# Altium footprint library _components.PcbLib: 53 footprints (part 2 of 4)
Each footprint in its own frame and in the unit in brackets; x right, y up, seen from the top. Pads: shape width x height; smd on the part's side, far side on the other; paste and mask are expansions set on the pad; w line width, h text height; cw(c..) or ccw(c..) is an arc to the next point about the centre after c.
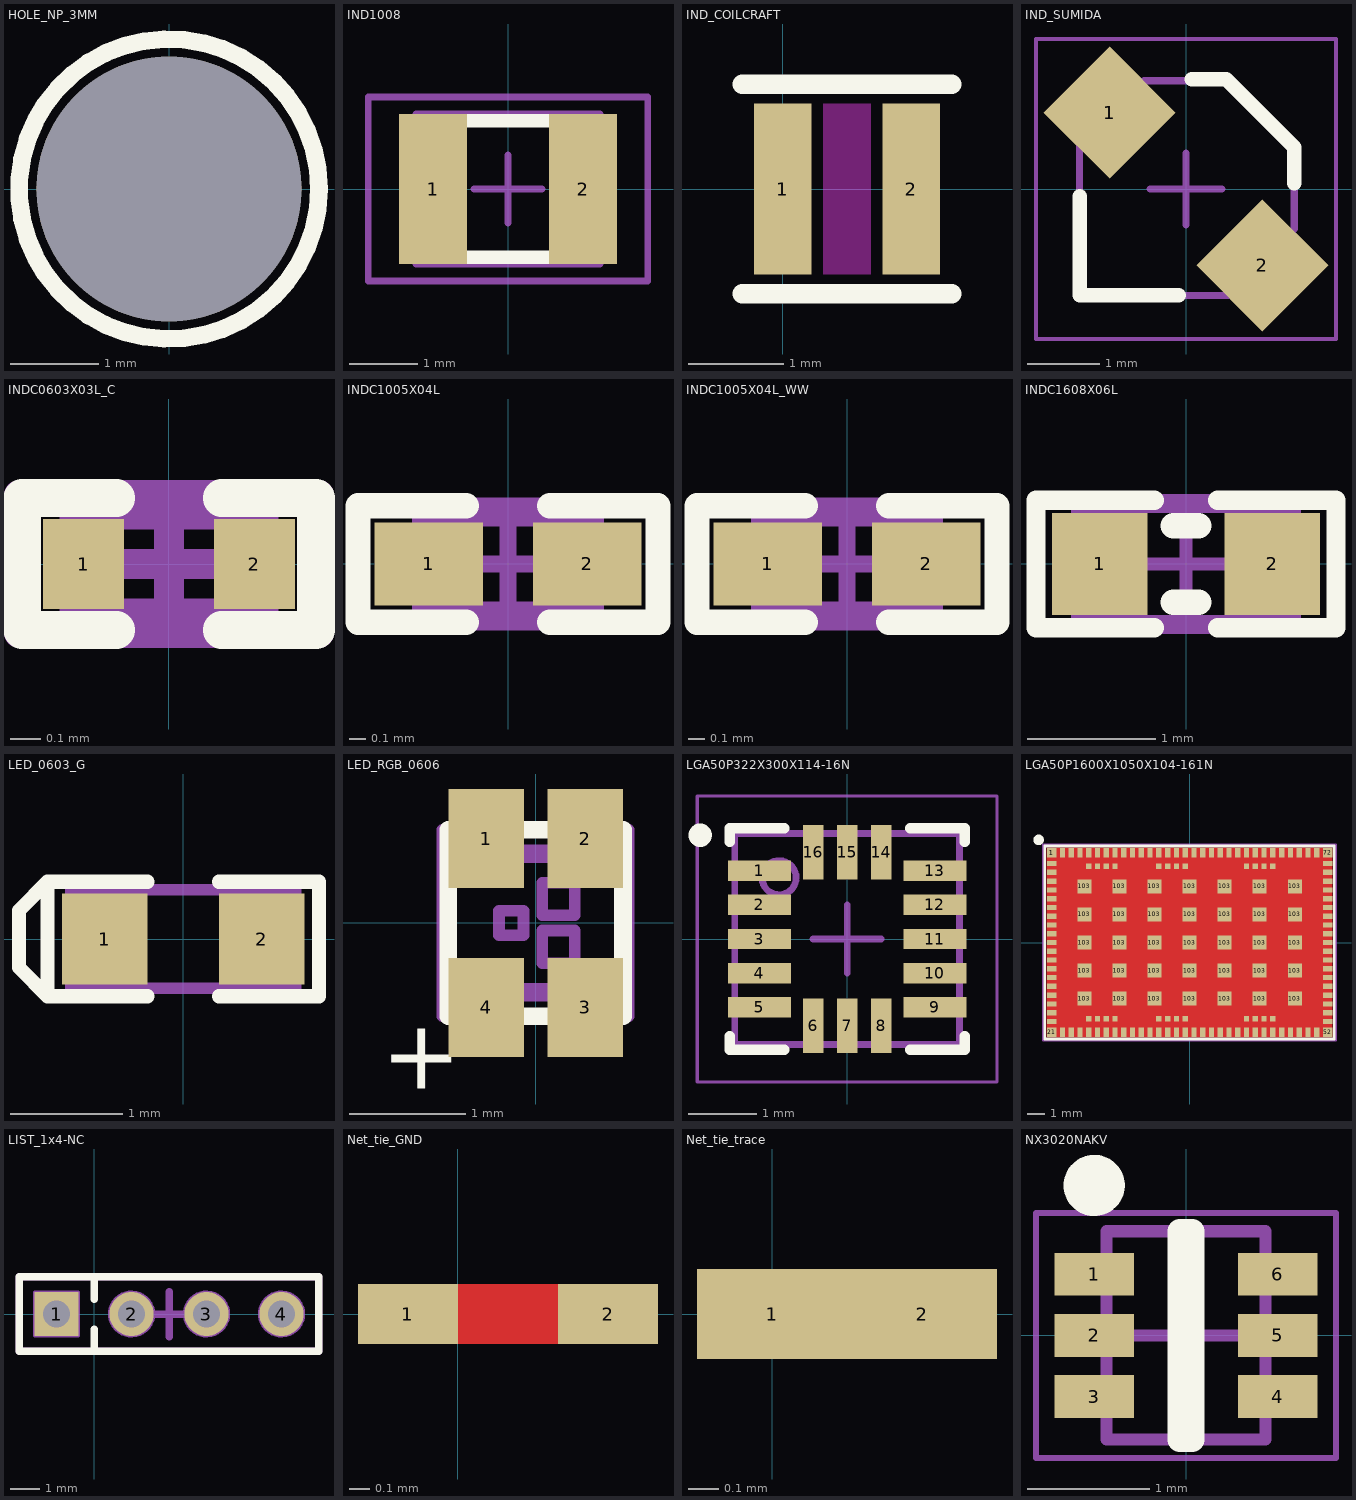
[diagram p1: the footprints below, top view; thin cyan lines are the x and y axes]

## HOLE_NP_3MM [mm] "Regular 3mm non-plated hole"
pads (1):
  round 3 hole 3 unplated paste+0 mask+0: ""(0,0)
Top Overlay:
  circle w0.2: c0,0 r1.7

## IND1008 [mm] "Chip Inductor, 2-Leads, Body 2.5x2.0x1.1 mm"
height 1.1
pads (2):
  rect 1x2.2 smd: 1(-1.1,0) 2(1.1,0)
Top Overlay:
  lines w0.2: -1.2,-1 1.2,-1 ; -1.2,1 1.2,1
Top Assembly Info:
  lines w0.1: -1.35,-1.1 -1.35,1.1 1.35,1.1 1.35,-1.1 -1.35,-1.1
  text ".Designator" at -0.4,-0.15 h0.38
Top Placement:
  lines w0.1: -0.5,0 0.5,0 ; 0,-0.5 0,0.5 ; -2.05,-1.35 -2.05,1.35 2.05,1.35 2.05,-1.35 -2.05,-1.35
3D body "74479787147.stp": height 0.89, standoff -0.01, extent -1.25,-1 1.25,1

## IND_COILCRAFT [mm]
pads (2):
  rect 0.6x1.8 smd: 1(0,0) 2(1.35,0)
Top Layer keep-out:
  rectangle: 0.425,-0.9 0.925,0.9
Top Overlay:
  lines w0.2: -0.425,-1.1 1.775,-1.1 ; -0.425,1.1 1.775,1.1

## IND_SUMIDA [mm]
height 1.3
pads (2):
  rect 1.3x1.3 smd rot 45: 1(-1.061,1.061) 2(1.061,-1.061)
Top Overlay:
  lines w0.2: -1.476,-0.1 -1.476,-1.476 -0.1,-1.476 ; 0.08,1.524 0.556,1.524 1.5,0.58 1.5,0.08
Top Assembly Info:
  lines w0.1: -1.476,0.58 -1.476,-1.476 0.58,-1.476 1.5,-0.556 1.5,0.58 0.58,1.5 -0.58,1.5 -1.476,0.604
  text ".Designator" at -0.275,-0.15 h0.3
Top Placement:
  lines w0.05: -2.08,-2.08 2.08,-2.08 2.08,2.08 -2.08,2.08 -2.08,-2.08
  lines w0.1: -0.5,0 0.5,0 ; 0,-0.5 0,0.5
3D body: height 0.9, standoff 0, extent 0.68,-1.482 1.475,-0.687
3D body: height 0.9, standoff 0, extent -1.476,0.699 -0.681,1.494
3D body: height 1.2, standoff 0, extent -1.389,-1.397 1.4,1.397
3D body: height 0.8, standoff 0, extent -1.476,-1.476 1.5,1.5

## INDC0603X03L_C [mm]
pads (2):
  rect 0.27x0.3 smd: 1(-0.285,0) 2(0.285,0)
Top Overlay:
  lines w0.125: -0.175,-0.22 -0.49,-0.22 -0.49,0.22 -0.175,0.22 ; 0.175,-0.22 0.49,-0.22 0.49,0.22 0.175,0.22
Top Assembly Info:
  lines w0.1: -0.315,-0.165 0.315,-0.165 0.315,0.165 -0.315,0.165 -0.315,-0.165
  text ".Designator" at -0.306,0.268 h0.3
Top Placement:
  lines w0.1: -0.165,0 0.165,0 ; 0,-0.165 0,0.165 ; -0.5,-0.23 0.5,-0.23 0.5,0.23 -0.5,0.23 -0.5,-0.23
3D body "User Library-smt_inductor-0201.step": height 0.26, standoff -0.01, extent -0.31,-0.16 0.31,0.16

## INDC1005X04L [mm] "0402 (imperial)"
pads (2):
  rect 0.65x0.5 smd: 1(-0.475,0) 2(0.475,0)
Top Overlay:
  lines w0.152: -0.25,-0.35 -0.9,-0.35 -0.9,0.35 -0.25,0.35 ; 0.25,-0.35 0.9,-0.35 0.9,0.35 0.25,0.35
Top Assembly Info:
  lines w0.1: -0.525,-0.275 -0.525,0.275 0.525,0.275 0.525,-0.275 -0.525,-0.275
  text ".Designator" at -0.432,-0.152 h0.3
Top Placement:
  lines w0.1: -0.275,0 0.275,0 ; 0,-0.275 0,0.275 ; -0.9,-0.35 -0.9,0.35 0.9,0.35 0.9,-0.35 -0.9,-0.35
3D body "User Library-Chip Inductor 0402.step": height 0.5, standoff 0, extent -0.5,-0.3 0.5,0.3

## INDC1005X04L_WW [mm]
pads (2):
  rect 0.65x0.5 smd: 1(-0.475,0) 2(0.475,0)
Top Overlay:
  lines w0.152: -0.25,-0.35 -0.9,-0.35 -0.9,0.35 -0.25,0.35 ; 0.25,-0.35 0.9,-0.35 0.9,0.35 0.25,0.35
Top Assembly Info:
  lines w0.1: -0.525,-0.275 0.525,-0.275 0.525,0.275 -0.525,0.275 -0.525,-0.275
  text ".Designator" at -0.432,-0.152 h0.3
Top Placement:
  lines w0.1: -0.275,0 0.275,0 ; 0,-0.275 0,0.275 ; -0.9,-0.35 0.9,-0.35 0.9,0.35 -0.9,0.35 -0.9,-0.35
3D body "User Library-INDC1005X50-MURATA_LQW15A.STEP": height 0.51, standoff 0, extent -0.5,-0.3 0.5,0.3

## INDC1608X06L [mm]
pads (2):
  rect 0.75x0.8 smd: 1(-0.675,0) 2(0.675,0)
Top Overlay:
  lines w0.152: -0.25,-0.5 -1.175,-0.5 -1.175,0.5 -0.25,0.5 ; 0.25,-0.5 1.175,-0.5 1.175,0.5 0.25,0.5
  lines w0.2: -0.1,-0.3 0.1,-0.3 ; -0.1,0.3 0.1,0.3
Top Assembly Info:
  lines w0.1: -0.85,-0.45 -0.85,0.45 0.85,0.45 0.85,-0.45 -0.85,-0.45
  text ".Designator" at -0.7,-0.2 h0.38
Top Placement:
  lines w0.1: -0.45,0 0.45,0 ; 0,-0.45 0,0.45 ; -1.175,-0.5 1.175,-0.5 1.175,0.5 -1.175,0.5 -1.175,-0.5
3D body "User Library-Chip Inductor.step": height 0.8, standoff 0, extent -0.8,-0.475 0.8,0.475

## LED_0603_G [mil]
pads (2):
  rect 30x32 smd: 1(-27.5,0) 2(27.5,0)
Top Overlay:
  lines w5: -12.5,-20 -47.5,-20 ; -12.5,20 -47.5,20 ; 12.5,-20 47.5,-20 47.5,20 12.5,20 ; -47.5,-20 -47.5,20 ; -47.5,-20 -57.5,-10 -57.5,10 -47.5,20
Top Assembly Info:
  lines w3.94: -27.56,-17.26 -27.56,17.26 ; -23.62,-17.26 -23.62,17.26 ; 23.62,-17.26 23.62,17.26 ; 27.56,-17.26 27.56,17.26 ; -39.37,-17.26 39.37,-17.26 39.37,17.26 -39.37,17.26 -39.37,-17.26
  text ".Designator" at -19.68,-4.92 h12
3D body "User Library-led_0603_green.step": height 23.62, standoff 0, extent -31.63,-15.75 32.15,15.75

## LED_RGB_0606 [mm]
pads (4):
  rect 0.65x0.85 smd paste+0: 1(-0.425,0.725) 2(0.425,0.725) 3(0.425,-0.725) 4(-0.425,-0.725)
Top Overlay:
  lines w0.15: -0.75,-0.8 0.75,-0.8 ; -0.75,0.8 0.75,0.8
  lines w0.152: -0.75,-0.8 -0.75,0.8 ; 0.75,-0.8 0.75,0.8
  text "+" at -1.325,-1.425 h0.6
Top Assembly Info:
  lines w0.1: -0.8,-0.625 -0.537,-0.625 ; -0.8,-0.565 0.8,-0.565 ; -0.8,0.565 0.8,0.565 ; -0.8,0.625 -0.537,0.625 ; -0.668,-0.8 cw(c-0.423,-0.851) -0.178,-0.8 ; -0.668,0.8 ccw(c-0.423,0.85) -0.178,0.8 ; -0.309,-0.625 0.309,-0.625 ; -0.309,0.625 0.309,0.625 ; 0.178,-0.8 cw(c0.423,-0.85) 0.668,-0.8 ; 0.178,0.8 ccw(c0.423,0.851) 0.668,0.8 ; 0.537,-0.625 0.8,-0.625 ; 0.537,0.625 0.8,0.625 ; -0.8,-0.8 -0.537,-0.8 cw(c-0.423,-0.851) -0.309,-0.8 0.309,-0.8 cw(c0.423,-0.85) 0.537,-0.8 0.8,-0.8 0.8,0.8 0.537,0.8 cw(c0.423,0.851) 0.309,0.8 -0.309,0.8 cw(c-0.423,0.85) -0.537,0.8 -0.8,0.8 -0.8,-0.8 ; -0.315,-0.105 -0.315,0.105 -0.105,0.105 -0.105,-0.105 -0.315,-0.105 ; 0.055,-0.345 0.055,-0.065 0.335,-0.065 0.335,-0.345 0.055,-0.345 ; 0.055,0.065 0.335,0.065 0.335,0.345 0.055,0.345 0.055,0.065
  text ".Designator" at -0.675,0.975 h0.38
3D body: height 0.27, standoff 0.18, extent 0.05,-0.35 0.35,-0.05
3D body: height 0.27, standoff 0.18, extent 0.05,0.05 0.35,0.35
3D body: height 0.27, standoff 0.18, extent -0.35,-0.15 -0.05,0.15
3D body: height 0.35, standoff 0.18, extent -0.75,-0.55 0.75,0.55
3D body: height 0.18, standoff 0, extent -0.75,-0.8 0.75,0.8

## LGA50P322X300X114-16N [mm]
pads (16):
  rect 0.925x0.3 smd mask+0.06: 1(-1.288,1) 2(-1.288,0.5) 3(-1.288,0) 4(-1.288,-0.5) 5(-1.288,-1) 9(1.288,-1) 10(1.288,-0.5) 11(1.288,0) 12(1.288,0.5) 13(1.288,1)
  rect 0.3x0.8 smd mask+0.06: 6(-0.5,-1.275) 7(0,-1.275) 8(0.5,-1.275) 14(0.5,1.275) 15(0,1.275) 16(-0.5,1.275)
Top Overlay:
  circle w0.25: c-2.159,1.524 r0.046
  lines w0.15: -1.725,-1.425 -1.725,-1.625 -0.925,-1.625 ; -1.725,1.425 -1.725,1.625 -0.925,1.625 ; 0.925,-1.625 1.725,-1.625 1.725,-1.425 ; 0.925,1.625 1.725,1.625 1.725,1.425
Top Assembly Info:
  circle w0.1: c-1,0.9 r0.25
  lines w0.1: -1.65,-1.55 1.65,-1.55 1.65,1.55 -1.65,1.55 -1.65,-1.55
Top Placement:
  lines w0.05: -2.2,-2.1 2.2,-2.1 2.2,2.1 -2.2,2.1 -2.2,-2.1
  lines w0.1: -0.5,0 0.5,0 ; 0,-0.5 0,0.5
3D body "LGA50P322X300X114-16N.step": height 1.14, standoff 0, extent -1.65,-1.55 1.65,1.55

## LGA50P1600X1050X104-161N [mm]
height 1.04
pads (161):
  rect 0.54x0.54 smd mask+0.05: 1(-7.87,5.12) 21(-7.87,-5.12) 52(7.87,-5.12) 72(7.87,5.12)
  rect 0.54x0.3 smd mask+0.05: 2(-7.87,4.5) 3(-7.87,4) 4(-7.87,3.5) 5(-7.87,3) 6(-7.87,2.5) 7(-7.87,2) 8(-7.87,1.5) 9(-7.87,1) 10(-7.87,0.5) 11(-7.87,0) 12(-7.87,-0.5) 13(-7.87,-1) 14(-7.87,-1.5) 15(-7.87,-2) 16(-7.87,-2.5) 17(-7.87,-3) 18(-7.87,-3.5) 19(-7.87,-4) 20(-7.87,-4.5) 53(7.87,-4.5) 54(7.87,-4) 55(7.87,-3.5) 56(7.87,-3) 57(7.87,-2.5) 58(7.87,-2) 59(7.87,-1.5) 60(7.87,-1) 61(7.87,-0.5) 62(7.87,0) 63(7.87,0.5) 64(7.87,1) 65(7.87,1.5) 66(7.87,2) 67(7.87,2.5) 68(7.87,3) 69(7.87,3.5) 70(7.87,4) 71(7.87,4.5)
  rect 0.3x0.54 smd mask+0.05: 22(-7.25,-5.12) 23(-6.75,-5.12) 24(-6.25,-5.12) 25(-5.75,-5.12) 26(-5.25,-5.12) 27(-4.75,-5.12) 28(-4.25,-5.12) 29(-3.75,-5.12) 30(-3.25,-5.12) 31(-2.75,-5.12) 32(-2.25,-5.12) 33(-1.75,-5.12) 34(-1.25,-5.12) 35(-0.75,-5.12) 36(-0.25,-5.12) 37(0.25,-5.12) 38(0.75,-5.12) 39(1.25,-5.12) 40(1.75,-5.12) 41(2.25,-5.12) 42(2.75,-5.12) 43(3.25,-5.12) 44(3.75,-5.12) 45(4.25,-5.12) 46(4.75,-5.12) 47(5.25,-5.12) 48(5.75,-5.12) 49(6.25,-5.12) 50(6.75,-5.12) 51(7.25,-5.12) 73(7.25,5.12) 74(6.75,5.12) 75(6.25,5.12) 76(5.75,5.12) 77(5.25,5.12) 78(4.75,5.12) 79(4.25,5.12) 80(3.75,5.12) 81(3.25,5.12) 82(2.75,5.12) 83(2.25,5.12) 84(1.75,5.12) 85(1.25,5.12) 86(0.75,5.12) 87(0.25,5.12) 88(-0.25,5.12) 89(-0.75,5.12) 90(-1.25,5.12) 91(-1.75,5.12) 92(-2.25,5.12) 93(-2.75,5.12) 94(-3.25,5.12) 95(-3.75,5.12) 96(-4.25,5.12) 97(-4.75,5.12) 98(-5.25,5.12) 99(-5.75,5.12) 100(-6.25,5.12) 101(-6.75,5.12) 102(-7.25,5.12)
  rect 0.8x0.8 smd mask+0.05: 103(-6,-3.2) 103(-6,-1.6) 103(-6,0) 103(-6,1.6) 103(-6,3.2) 103(-4,-3.2) 103(-4,-1.6) 103(-4,0) 103(-4,1.6) 103(-4,3.2) 103(-2,-3.2) 103(-2,-1.6) 103(-2,0) 103(-2,1.6) 103(-2,3.2) 103(0,-3.2) 103(0,-1.6) 103(0,0) 103(0,1.6) 103(0,3.2) 103(2,-3.2) 103(2,-1.6) 103(2,0) 103(2,1.6) 103(2,3.2) 103(4,-3.2) 103(4,-1.6) 103(4,0) 103(4,1.6) 103(4,3.2) 103(6,-3.2) 103(6,-1.6) 103(6,0) 103(6,1.6) 103(6,3.2)
  rect 0.3x0.3 smd mask+0.05: 104(-5.75,-4.35) 105(-5.25,-4.35) 106(-4.75,-4.35) 107(-4.25,-4.35) 108(-1.75,-4.35) 109(-1.25,-4.35) 110(-0.75,-4.35) 111(-0.25,-4.35) 112(3.25,-4.35) 113(3.75,-4.35) 114(4.25,-4.35) 115(4.75,-4.35) 116(4.75,4.35) 117(4.25,4.35) 118(3.75,4.35) 119(3.25,4.35) 120(-0.25,4.35) 121(-0.75,4.35) 122(-1.25,4.35) 123(-1.75,4.35) 124(-4.25,4.35) 125(-4.75,4.35) 126(-5.25,4.35) 127(-5.75,4.35)
Top Layer:
  pour cut-out: -8.15,5.4 8.15,5.4 8.15,-5.4 -8.15,-5.4
Top Overlay:
  circle w0.3: c-8.605,5.85 r0.15
  lines w0.15: -8.25,-5.5 -8.25,5.5 8.25,5.5 8.25,-5.5 -8.25,-5.5
Top Assembly Info:
  circle w0.3: c-6.5,3.75 r0.15
  lines w0.1: -8.05,-5.3 -8.05,5.3 8.05,5.3 8.05,-5.3 -8.05,-5.3
  text ".Designator" at -0.25,-0.175 h0.38
Top Placement:
  circle w0.3: c-6.5,3.75 r0.15
  lines w0.1: -8.35,-5.6 8.35,-5.6 8.35,5.6 -8.35,5.6 -8.35,-5.6
3D body "nRF9160_v5.step": height 1.2, standoff 0, extent -8.05,-5.3 8.05,5.3

## LIST_1x4-NC [mm]
pads (4):
  rect 1.5x1.5 hole 0.9: 1(-1.27,0)
  round 1.5 hole 0.9: 2(1.27,0) 3(3.81,0) 4(6.35,0)
Top Overlay:
  lines w0.254: 0,-1.27 0,-0.508 ; 0,0.508 0,1.27 ; -2.54,-1.27 -2.54,1.27 7.62,1.27 7.62,-1.27 -2.54,-1.27
Top Assembly Info:
  circle w0.1: c6.35,0 r0.45
  circle w0.1: c6.35,0 r0.75
  circle w0.1: c3.81,0 r0.45
  circle w0.1: c3.81,0 r0.75
  circle w0.1: c1.27,0 r0.75
  circle w0.1: c-1.27,0 r0.45
  circle w0.1: c1.27,0 r0.45
  lines w0.1: 0,-1.27 0,-0.508 ; 0,0.508 0,1.27 ; -2.54,-1.27 -2.54,1.27 7.62,1.27 7.62,-1.27 -2.54,-1.27 ; -2.02,-0.75 -2.02,0.75 -0.52,0.75 -0.52,-0.75 -2.02,-0.75
  text ".Designator" at -0.4,-0.2 h0.38
Mechanical 8:
  circle w0.1: c1.27,0 r0.75
  circle w0.1: c1.27,0 r0.45
  circle w0.1: c-1.27,0 r0.45
  lines w0.1: -2.02,-0.75 -2.02,0.75 -0.52,0.75 -0.52,-0.75 -2.02,-0.75
Top Placement:
  lines w0.254: 1.778,0 3.302,0 ; 2.54,-0.762 2.54,0.762 ; -2.54,-1.27 7.62,-1.27 7.62,1.27 -2.54,1.27 -2.54,-1.27

## Net_tie_GND [mm]
pads (2):
  rect 0.5x0.3 smd paste+0 mask+0: 1(-0.25,0) 2(0.75,0)
Top Layer:
  lines w0.3: -0.1,0 0.6,0

## Net_tie_trace [mm]
pads (2):
  rect 0.5x0.3 smd paste+0 mask+0: 1(0,0) 2(0.5,0)
Top Layer:
  lines w0.3: 0,0 0.5,0

## NX3020NAKV [mm]
pads (6):
  rect 0.65x0.35 smd: 1(-0.75,0.5) 2(-0.75,0) 3(-0.75,-0.5) 4(0.75,-0.5) 5(0.75,0) 6(0.75,0.5)
Top Overlay:
  circle w0.25: c-0.75,1.225 r0.125
  lines w0.2: -0.05,-0.85 0.05,-0.85 0.05,0.85 -0.05,0.85 -0.05,-0.85
Top Assembly Info:
  lines w0.1: -0.65,-0.85 0.65,-0.85 0.65,0.85 -0.65,0.85 -0.65,-0.85
Top Placement:
  lines w0.05: -1.225,-1 -1.225,1 1.225,1 1.225,-1 -1.225,-1
  lines w0.1: -0.5,0 0.5,0 ; 0,-0.5 0,0.5
3D body "NX3020NAKV2.step": height 0.6, standoff 0, extent -0.8,-0.848 0.8,0.848